# Altium footprint library ArduinoMega2560.PcbLib: 1 footprints
Each footprint in its own frame and in the unit in brackets; x right, y up, seen from the top. Pads: shape width x height; smd on the part's side, far side on the other; paste and mask are expansions set on the pad; w line width, h text height; cw(c..) or ccw(c..) is an arc to the next point about the centre after c.
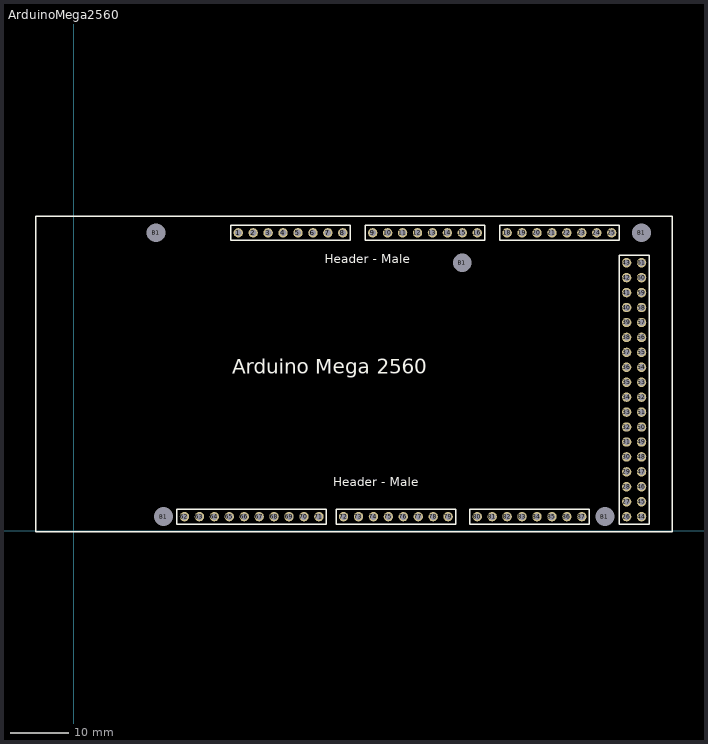
[diagram p0: the footprint, top view; thin cyan lines are the x and y axes]

## ArduinoMega2560 [mm]
pads (91):
  round 1.6 hole 1.1: 1(27.94,50.673) 2(30.48,50.673) 3(33.02,50.673) 4(35.56,50.673) 5(38.1,50.673) 6(40.64,50.673) 7(43.18,50.673) 8(45.72,50.673) 9(50.8,50.673) 10(53.34,50.673) 11(55.88,50.673) 12(58.42,50.673) 13(60.96,50.673) 14(63.5,50.673) 15(66.04,50.673) 16(68.58,50.673) 18(73.66,50.673) 19(76.2,50.673) 20(78.74,50.673) 21(81.28,50.673) 22(83.82,50.673) 23(86.36,50.673) 24(88.9,50.673) 25(91.44,50.673) 26(93.98,2.413) 27(93.98,4.953) 28(93.98,7.493) 29(93.98,10.033) 30(93.98,12.573) 31(93.98,15.113) 32(93.98,17.653) 33(93.98,20.193) 34(93.98,22.733) 35(93.98,25.273) 36(93.98,27.813) 37(93.98,30.353) 38(93.98,32.893) 39(93.98,35.433) 40(93.98,37.973) 41(93.98,40.513) 42(93.98,43.053) 43(93.98,45.593) 44(96.52,2.413) 45(96.52,4.953) 46(96.52,7.493) 47(96.52,10.033) 48(96.52,12.573) 49(96.52,15.113) 50(96.52,17.653) 51(96.52,20.193) 52(96.52,22.733) 53(96.52,25.273) 54(96.52,27.813) 55(96.52,30.353) 56(96.52,32.893) 57(96.52,35.433) 58(96.52,37.973) 59(96.52,40.513) 60(96.52,43.053) 61(96.52,45.593) 62(18.796,2.413) 63(21.336,2.413) 64(23.876,2.413) 65(26.416,2.413) 66(28.956,2.413) 67(31.496,2.413) 68(34.036,2.413) 69(36.576,2.413) 70(39.116,2.413) 71(41.656,2.413) 72(45.847,2.413) 73(48.387,2.413) 74(50.927,2.413) 75(53.467,2.413) 76(56.007,2.413) 77(58.547,2.413) 78(61.087,2.413) 79(63.627,2.413) 80(68.58,2.413) 81(71.12,2.413) 82(73.66,2.413) 83(76.2,2.413) 84(78.74,2.413) 85(81.28,2.413) 86(83.82,2.413) 87(86.36,2.413)
  round 1.524 hole 3.2: B1(13.97,50.673) B1(15.24,2.413) B1(66.04,45.593) B1(90.297,2.413) B1(96.52,50.673)
Top Overlay:
  lines w0.254: -6.477,-0.127 -6.477,13.271 -6.477,40.069 -6.477,53.467 101.727,53.467 101.727,-0.127 -6.477,-0.127 ; 17.526,1.143 17.526,2.413 17.526,3.683 42.926,3.683 42.926,1.143 17.526,1.143 ; 26.67,49.403 26.67,51.943 46.99,51.943 46.99,49.403 26.67,49.403 ; 44.577,1.143 44.577,3.683 64.897,3.683 64.897,1.143 44.577,1.143 ; 49.53,49.403 49.53,51.943 69.85,51.943 69.85,49.403 49.53,49.403 ; 67.31,1.143 67.31,3.683 87.63,3.683 87.63,1.143 67.31,1.143 ; 72.39,49.403 72.39,51.943 92.71,51.943 92.71,49.403 72.39,49.403 ; 92.71,1.143 97.79,1.143 97.79,46.863 92.71,46.863 92.71,1.143
  text "Arduino Mega 2560" at 26.924,26.741 h2.5
  text "Header - Male" at 44.069,7.62 h1.5
  text "Header - Male" at 42.672,45.466 h1.5
3D body "User Library-ARDUINO_MEGA_2560.STEP": height 15.6, standoff 0.35, extent -6.35,0 101.6,53.34
3D body "User Library-1x8 TH Pitch 2_54mm.STEP": height 9.2, standoff -3.5, extent 26.67,49.403 46.99,51.943
3D body "User Library-1x8 TH Pitch 2_54mm.STEP": height 9.2, standoff -3.5, extent 49.53,49.403 69.85,51.943
3D body "User Library-1x8 TH Pitch 2_54mm.STEP": height 9.2, standoff -3.5, extent 72.39,49.403 92.71,51.943
3D body "User Library-1x8 TH Pitch 2_54mm.STEP": height 9.2, standoff -3.5, extent 67.31,1.016 87.63,3.556
3D body "User Library-1x8 TH Pitch 2_54mm.STEP": height 9.2, standoff -3.5, extent 44.577,1.016 64.897,3.556
3D body "User Library-1x10 TH Pitch 2_54mm.STEP": height 9.2, standoff -3.5, extent 17.526,1.016 42.926,3.556
3D body "Header, Male, 2.54mm, 1x18.STEP": height 8.54, standoff -3, extent 92.71,1.143 95.25,46.863
3D body "Header, Male, 2.54mm, 1x18.STEP": height 8.54, standoff -3, extent 95.377,1.143 97.917,46.863